# Altium footprint library Connectors THD.PcbLib: 631 footprints (part 2 of 46) (continued)
## 3M_10236-5212PC [mm] "36 contacts, Mini D Ribbon (MDR), 102 Series, .050\" Boardmount Through-hole Right Angle Receptacle-Shielded" (continued)
  text "17" at 10.8,-5.247 h1.02
  text "18" at 12.06,-3.342 h1.02
  text "36" at 11.935,0.468 h1.02
3D body: height 9.4, standoff -3.81, extent -21.717,-5.647 21.717,11.117

## 3M_10236-6212PC [mm] "36 contacts, Mini D Ribbon (MDR), 102 Series, .050\" Boardmount Through-hole Vertical Receptacle-Shielded"
height 9.4
pads (38):
  round 1.4 hole 0.8: 1(10.795,2.86) 2(9.525,0.955) 3(8.255,2.86) 4(6.985,0.955) 5(5.715,2.86) 6(4.445,0.955) 7(3.175,2.86) 8(1.905,0.955) 9(0.635,2.86) 10(-0.635,0.955) 11(-1.905,2.86) 12(-3.175,0.955) 13(-4.445,2.86) 14(-5.715,0.955) 15(-6.985,2.86) 16(-8.255,0.955) 17(-9.525,2.86) 18(-10.795,0.955) 19(10.795,-0.955) 20(9.525,-2.86) 21(8.255,-0.955) 22(6.985,-2.86) 23(5.715,-0.955) 24(4.445,-2.86) 25(3.175,-0.955) 26(1.905,-2.86) 27(0.635,-0.955) 28(-0.635,-2.86) 29(-1.905,-0.955) 30(-3.175,-2.86) 31(-4.445,-0.955) 32(-5.715,-2.86) 33(-6.985,-0.955) 34(-8.255,-2.86) 35(-9.525,-0.955) 36(-10.795,-2.86)
  round 5.5 hole 2.8: 37(-18.796,0) 38(18.796,0)
Top Overlay:
  circle w0.3: c10.795,5.207 r0.15
  lines w0.2: -21.717,-0.413 -21.717,-4.318 -20.447,-4.318 -20.447,-4.572 20.447,-4.572 20.447,-4.318 21.717,-4.318 21.717,-0.413 ; -21.717,0.413 -21.717,4.318 -20.447,4.318 -20.447,4.572 20.447,4.572 20.447,4.318 21.717,4.318 21.717,0.413 ; -21.463,-4.318 -21.463,-1.261 ; -21.463,1.261 -21.463,4.318 ; -16.764,-2.139 -16.764,-3.556 -14.224,-3.556 -14.224,3.556 -16.764,3.556 -16.764,2.139 ; -16.31,-1.587 -15.494,-1.587 -15.494,1.587 -16.31,1.587 ; -16.129,-3.556 -16.129,-1.587 ; -16.129,1.587 -16.129,3.556 ; -13.323,1.725 cw(c-12.065,1.896) -12.392,3.123 ; -12.86,-0.044 -12.355,-1.928 ; 12.811,2.933 cw(c12.065,1.905) 13.292,1.576 12.878,0.032 ; 16.129,-3.556 16.129,-1.587 ; 16.129,1.587 16.129,3.556 ; 16.31,-1.587 15.494,-1.587 15.494,1.587 16.31,1.587 ; 16.764,-2.139 16.764,-3.556 14.224,-3.556 14.224,3.556 16.764,3.556 16.764,2.139 ; 21.463,-4.318 21.463,-1.261 ; 21.463,1.261 21.463,4.318
  text "1" at 12.019,2.246 h1.02
  text "2" at 10.857,0.468 h1.02
  text "20" at 10.665,-3.459 h1.02
  text "19" at 11.831,-1.436 h1.02
  text "35" at -12.185,-1.569 h1.02
  text "17" at -11.933,2.241 h1.02
  text "18" at -13.34,0.336 h1.02
  text "36" at -13.465,-3.464 h1.02
Mechanical 8:
  drawing of 156 lines, arcs and shapes, not listed
Mechanical 14:
  circle w0.1: c-18.796,0 r1.245
  circle w0.1: c18.796,0 r1.245
  lines w0.1: -21.463,-4.318 -21.463,4.318 ; -16.129,-3.556 -16.129,-1.587 ; -16.129,1.587 -16.129,3.556 ; 16.129,-3.556 16.129,-1.587 ; 16.129,1.587 16.129,3.556 ; 21.463,-4.318 21.463,4.318 ; -21.717,-4.318 -21.717,4.318 -20.447,4.318 -20.447,4.572 20.447,4.572 20.447,4.318 21.717,4.318 21.717,-4.318 20.447,-4.318 20.447,-4.572 -20.447,-4.572 -20.447,-4.318 -21.717,-4.318 ; -16.764,-3.556 -16.764,-1.587 -15.494,-1.587 -15.494,1.587 -16.764,1.587 -16.764,3.556 -14.224,3.556 -14.224,-3.556 -16.764,-3.556 ; -13.292,1.576 cw(c-12.065,1.905) -12.065,3.175 12.065,3.175 cw(c12.065,1.905) 13.292,1.576 12.286,-2.178 cw(c11.015,-1.868) 10.987,-3.175 -10.987,-3.175 cw(c-11.015,-1.868) -12.286,-2.178 -13.292,1.576 ; 14.224,-3.556 14.224,3.556 16.764,3.556 16.764,1.587 15.494,1.587 15.494,-1.587 16.764,-1.587 16.764,-3.556 14.224,-3.556
  text "35" at -12.185,-1.569 h1.02
  text "17" at -11.933,2.241 h1.02
  text "18" at -13.34,0.336 h1.02
  text "36" at -13.465,-3.464 h1.02
  text "1" at 12.019,2.246 h1.02
  text "2" at 10.857,0.468 h1.02
  text "20" at 10.665,-3.459 h1.02
  text "19" at 11.831,-1.436 h1.02
3D body: height 11.18, standoff -3.4, extent -21.717,-4.572 21.717,4.572

## 3M_10268-6212PC [mm] "68 contacts, Mini D Ribbon (MDR), .050\" Boardmount Through-hole Vertical Receptacle - Shielded"
height 11
pads (70):
  round 1.4 hole 0.8: 1(20.955,2.858) 2(19.685,0.953) 3(18.415,2.858) 4(17.145,0.953) 5(15.875,2.858) 6(14.605,0.953) 7(13.335,2.858) 8(12.065,0.953) 9(10.795,2.858) 10(9.525,0.953) 11(8.255,2.858) 12(6.985,0.953) 13(5.715,2.858) 14(4.445,0.953) 15(3.175,2.858) 16(1.905,0.953) 17(0.635,2.858) 18(-0.635,0.953) 19(-1.905,2.858) 20(-3.175,0.953) 21(-4.445,2.858) 22(-5.715,0.953) 23(-6.985,2.858) 24(-8.255,0.953) 25(-9.525,2.858) 26(-10.795,0.953) 27(-12.065,2.858) 28(-13.335,0.953) 29(-14.605,2.858) 30(-15.875,0.953) 31(-17.145,2.858) 32(-18.415,0.953) 33(-19.685,2.858) 34(-20.955,0.953) 35(20.955,-0.952) 36(19.685,-2.857) 37(18.415,-0.952) 38(17.145,-2.857) 39(15.875,-0.952) 40(14.605,-2.857) 41(13.335,-0.952) 42(12.065,-2.857) 43(10.795,-0.952) 44(9.525,-2.857) 45(8.255,-0.952) 46(6.985,-2.857) 47(5.715,-0.952) 48(4.445,-2.857) 49(3.175,-0.952) 50(1.905,-2.857) 51(0.635,-0.952) 52(-0.635,-2.857) 53(-1.905,-0.952) 54(-3.175,-2.857) 55(-4.445,-0.952) 56(-5.715,-2.857) 57(-6.985,-0.952) 58(-8.255,-2.857) 59(-9.525,-0.952) 60(-10.795,-2.857) 61(-12.065,-0.952) 62(-13.335,-2.857) 63(-14.605,-0.952) 64(-15.875,-2.857) 65(-17.145,-0.952) 66(-18.415,-2.857) 67(-19.685,-0.952) 68(-20.955,-2.857)
  round 5.5 hole 2.8: 69(-28.956,0) 70(28.956,0)
Top Overlay:
  circle w0.3: c20.955,5.207 r0.15
  lines w0.2: -31.877,-0.684 -31.877,-4.318 -30.607,-4.318 -30.607,-4.572 30.607,-4.572 30.607,-4.318 31.877,-4.318 31.877,-0.684 ; -31.877,0.684 -31.877,4.318 -30.607,4.318 -30.607,4.572 30.607,4.572 30.607,4.318 31.877,4.318 31.877,0.684 ; -31.623,-4.318 -31.623,-1.374 ; -31.623,1.374 -31.623,4.318 ; -26.924,-2.207 -26.924,-3.556 -24.384,-3.556 -24.384,3.556 -26.924,3.556 -26.924,2.207 ; -26.41,-1.587 -25.654,-1.587 -25.654,1.588 -26.41,1.588 ; -26.289,-3.556 -26.289,-1.587 ; -26.289,1.588 -26.289,3.556 ; -23.483,1.734 cw(c-22.225,1.905) -22.551,3.132 ; -23.02,-0.035 -22.515,-1.919 ; 22.971,2.933 cw(c22.225,1.905) 23.452,1.576 23.038,0.032 ; 26.289,-3.556 26.289,-1.587 ; 26.289,1.588 26.289,3.556 ; 26.41,-1.587 25.654,-1.587 25.654,1.588 26.41,1.588 ; 26.924,-2.207 26.924,-3.556 24.384,-3.556 24.384,3.556 26.924,3.556 26.924,2.207 ; 31.623,-4.318 31.623,-1.374 ; 31.623,1.374 31.623,4.318
  text "1" at 22.106,2.358 h1.02
  text "2" at 20.622,0.453 h1.02
  text "35" at 22.051,-1.452 h1.02
  text "36" at 20.804,-3.357 h1.02
  text "34" at -23.693,0.453 h1.02
  text "33" at -22.4,2.358 h1.02
  text "67" at -22.4,-1.452 h1.02
  text "68" at -23.67,-3.357 h1.02
Mechanical 8:
  lines w0.1: -29.956,0 -28.956,0 -28.956,1 ; -21.955,-2.857 -20.955,-2.857 -20.955,-1.857 ; -21.955,0.953 -20.955,0.953 -20.955,1.953 ; -20.685,-0.952 -19.685,-0.952 -19.685,0.048 ; -20.685,2.858 -19.685,2.858 -19.685,3.858 ; -19.415,-2.857 -18.415,-2.857 -18.415,-1.857 ; -19.415,0.953 -18.415,0.953 -18.415,1.953 ; -18.145,-0.952 -17.145,-0.952 -17.145,0.048 ; -18.145,2.858 -17.145,2.858 -17.145,3.858 ; -16.875,-2.857 -15.875,-2.857 -15.875,-1.857 ; -16.875,0.953 -15.875,0.953 -15.875,1.953 ; -15.605,-0.952 -14.605,-0.952 -14.605,0.048 ; -15.605,2.858 -14.605,2.858 -14.605,3.858 ; -14.335,-2.857 -13.335,-2.857 -13.335,-1.857 ; -14.335,0.953 -13.335,0.953 -13.335,1.953 ; -13.065,-0.952 -12.065,-0.952 -12.065,0.048 ; -13.065,2.858 -12.065,2.858 -12.065,3.858 ; -11.795,-2.857 -10.795,-2.857 -10.795,-1.857 ; -11.795,0.953 -10.795,0.953 -10.795,1.953 ; -10.525,-0.952 -9.525,-0.952 -9.525,0.048 ; -10.525,2.858 -9.525,2.858 -9.525,3.858 ; -9.255,-2.857 -8.255,-2.857 -8.255,-1.857 ; -9.255,0.953 -8.255,0.953 -8.255,1.953 ; -7.985,-0.952 -6.985,-0.952 -6.985,0.048 ; -7.985,2.858 -6.985,2.858 -6.985,3.858 ; -6.715,-2.857 -5.715,-2.857 -5.715,-1.857 ; -6.715,0.953 -5.715,0.953 -5.715,1.953 ; -5.445,-0.952 -4.445,-0.952 -4.445,0.048 ; -5.445,2.858 -4.445,2.858 -4.445,3.858 ; -4.175,-2.857 -3.175,-2.857 -3.175,-1.857 ; -4.175,0.953 -3.175,0.953 -3.175,1.953 ; -2.905,-0.952 -1.905,-0.952 -1.905,0.048 ; -2.905,2.858 -1.905,2.858 -1.905,3.858 ; -1.635,-2.857 -0.635,-2.857 -0.635,-1.857 ; -1.635,0.953 -0.635,0.953 -0.635,1.953 ; -1,0 0,0 0,-1 ; -0.365,-0.952 0.635,-0.952 0.635,0.048 ; -0.365,2.858 0.635,2.858 0.635,3.858 ; 0.905,-2.857 1.905,-2.857 1.905,-1.857 ; 0.905,0.953 1.905,0.953 1.905,1.953 ; 2.175,-0.952 3.175,-0.952 3.175,0.048 ; 2.175,2.858 3.175,2.858 3.175,3.858 ; 3.445,-2.857 4.445,-2.857 4.445,-1.857 ; 3.445,0.953 4.445,0.953 4.445,1.953 ; 4.715,-0.952 5.715,-0.952 5.715,0.048 ; 4.715,2.858 5.715,2.858 5.715,3.858 ; 5.985,-2.857 6.985,-2.857 6.985,-1.857 ; 5.985,0.953 6.985,0.953 6.985,1.953 ; 7.255,-0.952 8.255,-0.952 8.255,0.048 ; 7.255,2.858 8.255,2.858 8.255,3.858 ; 8.525,-2.857 9.525,-2.857 9.525,-1.857 ; 8.525,0.953 9.525,0.953 9.525,1.953 ; 9.795,-0.952 10.795,-0.952 10.795,0.048 ; 9.795,2.858 10.795,2.858 10.795,3.858 ; 11.065,-2.857 12.065,-2.857 12.065,-1.857 ; 11.065,0.953 12.065,0.953 12.065,1.953 ; 12.335,-0.952 13.335,-0.952 13.335,0.048 ; 12.335,2.858 13.335,2.858 13.335,3.858 ; 13.605,-2.857 14.605,-2.857 14.605,-1.857 ; 13.605,0.953 14.605,0.953 14.605,1.953 ; 14.875,-0.952 15.875,-0.952 15.875,0.048 ; 14.875,2.858 15.875,2.858 15.875,3.858 ; 16.145,-2.857 17.145,-2.857 17.145,-1.857 ; 16.145,0.953 17.145,0.953 17.145,1.953 ; 17.415,-0.952 18.415,-0.952 18.415,0.048 ; 17.415,2.858 18.415,2.858 18.415,3.858 ; 18.685,-2.857 19.685,-2.857 19.685,-1.857 ; 18.685,0.953 19.685,0.953 19.685,1.953 ; 19.955,-0.952 20.955,-0.952 20.955,0.048 ; 19.955,2.858 20.955,2.858 20.955,3.858 ; 27.956,0 28.956,0 28.956,1
Mechanical 14:
  drawing of 252 lines, arcs and shapes, not listed
3D body: height 11.18, standoff -3.4, extent -31.877,-4.572 31.877,4.572

## 3M_950420-6102-AR [mm] "20 Contacts - mm x 2 mm Straight, Boardmount Socket"
height 4.3
pads (20):
  round 1.5 hole 0.8: 1(-9,1) 2(-9,-1) 3(-7,1) 4(-7,-1) 5(-5,1) 6(-5,-1) 7(-3,1) 8(-3,-1) 9(-1,1) 10(-1,-1) 11(1,1) 12(1,-1) 13(3,1) 14(3,-1) 15(5,1) 16(5,-1) 17(7,1) 18(7,-1) 19(9,1) 20(9,-1)
Top Overlay:
  circle w0.3: c-8.925,2.925 r0.15
  lines w0.2: -10.25,-2.3 10.25,-2.3 10.25,2.3 -10.25,2.3 -10.25,-2.3
  text "1" at -10.988,0.55 h1.2
  text "20" at 10.71,-1.565 h1.2
Mechanical 8:
  lines w0.1: -9.5,-1 -9,-1 ; -9.5,1 -9,1 ; -9,-1.5 -9,-1 ; -9,-0.5 -9,-1 ; -9,0.5 -9,1 ; -9,1.5 -9,1 ; -8.5,-1 -9,-1 ; -8.5,1 -9,1 ; -7.5,-1 -7,-1 ; -7.5,1 -7,1 ; -7,-1.5 -7,-1 ; -7,-0.5 -7,-1 ; -7,0.5 -7,1 ; -7,1.5 -7,1 ; -6.5,-1 -7,-1 ; -6.5,1 -7,1 ; -5.5,-1 -5,-1 ; -5.5,1 -5,1 ; -5,-1.5 -5,-1 ; -5,-0.5 -5,-1 ; -5,0.5 -5,1 ; -5,1.5 -5,1 ; -4.5,-1 -5,-1 ; -4.5,1 -5,1 ; -3.5,-1 -3,-1 ; -3.5,1 -3,1 ; -3,-1.5 -3,-1 ; -3,-0.5 -3,-1 ; -3,0.5 -3,1 ; -3,1.5 -3,1 ; -2.5,-1 -3,-1 ; -2.5,1 -3,1 ; -1.5,-1 -1,-1 ; -1.5,1 -1,1 ; -1,-1.5 -1,-1 ; -1,-0.5 -1,-1 ; -1,0.5 -1,1 ; -1,1.5 -1,1 ; -0.5,-1 -1,-1 ; -0.5,0 0,0 ; -0.5,1 -1,1 ; 0,-0.5 0,0 ; 0,0.5 0,0 ; 0.5,-1 1,-1 ; 0.5,0 0,0 ; 0.5,1 1,1 ; 1,-1.5 1,-1 ; 1,-0.5 1,-1 ; 1,0.5 1,1 ; 1,1.5 1,1 ; 1.5,-1 1,-1 ; 1.5,1 1,1 ; 2.5,-1 3,-1 ; 2.5,1 3,1 ; 3,-1.5 3,-1 ; 3,-0.5 3,-1 ; 3,0.5 3,1 ; 3,1.5 3,1 ; 3.5,-1 3,-1 ; 3.5,1 3,1 ; 4.5,-1 5,-1 ; 4.5,1 5,1 ; 5,-1.5 5,-1 ; 5,-0.5 5,-1 ; 5,0.5 5,1 ; 5,1.5 5,1 ; 5.5,-1 5,-1 ; 5.5,1 5,1 ; 6.5,-1 7,-1 ; 6.5,1 7,1 ; 7,-1.5 7,-1 ; 7,-0.5 7,-1 ; 7,0.5 7,1 ; 7,1.5 7,1 ; 7.5,-1 7,-1 ; 7.5,1 7,1 ; 8.5,-1 9,-1 ; 8.5,1 9,1 ; 9,-1.5 9,-1 ; 9,-0.5 9,-1 ; 9,0.5 9,1 ; 9,1.5 9,1 ; 9.5,-1 9,-1 ; 9.5,1 9,1
Mechanical 14:
  drawing of 245 lines, arcs and shapes, not listed
  text "1" at -10.988,0.55 h1.2
  text "20" at 10.71,-1.565 h1.2
3D body: height 4.3, standoff -2.7, extent -10.25,-2.3 10.25,2.3

## 3M_950432-6102-AR [mm] "32 Contacts - mm x 2 mm Straight, Boardmount Socket"
height 4.3
pads (32):
  round 1.5 hole 0.8: 1(-15,1) 2(-15,-1) 3(-13,1) 4(-13,-1) 5(-11,1) 6(-11,-1) 7(-9,1) 8(-9,-1) 9(-7,1) 10(-7,-1) 11(-5,1) 12(-5,-1) 13(-3,1) 14(-3,-1) 15(-1,1) 16(-1,-1) 17(1,1) 18(1,-1) 19(3,1) 20(3,-1) 21(5,1) 22(5,-1) 23(7,1) 24(7,-1) 25(9,1) 26(9,-1) 27(11,1) 28(11,-1) 29(13,1) 30(13,-1) 31(15,1) 32(15,-1)
Top Overlay:
  circle w0.3: c-14.925,2.925 r0.15
  lines w0.2: -16.25,-2.3 -16.25,2.3 16.25,2.3 16.25,-2.3 -16.25,-2.3
  text "32" at 16.685,-1.515 h1.2
  text "1" at -16.988,0.55 h1.2
Mechanical 8:
  lines w0.1: -15.5,-1 -15,-1 ; -15.5,1 -15,1 ; -15,-1.5 -15,-1 ; -15,-0.5 -15,-1 ; -15,0.5 -15,1 ; -15,1.5 -15,1 ; -14.5,-1 -15,-1 ; -14.5,1 -15,1 ; -13.5,-1 -13,-1 ; -13.5,1 -13,1 ; -13,-1.5 -13,-1 ; -13,-0.5 -13,-1 ; -13,0.5 -13,1 ; -13,1.5 -13,1 ; -12.5,-1 -13,-1 ; -12.5,1 -13,1 ; -11.5,-1 -11,-1 ; -11.5,1 -11,1 ; -11,-1.5 -11,-1 ; -11,-0.5 -11,-1 ; -11,0.5 -11,1 ; -11,1.5 -11,1 ; -10.5,-1 -11,-1 ; -10.5,1 -11,1 ; -9.5,-1 -9,-1 ; -9.5,1 -9,1 ; -9,-1.5 -9,-1 ; -9,-0.5 -9,-1 ; -9,0.5 -9,1 ; -9,1.5 -9,1 ; -8.5,-1 -9,-1 ; -8.5,1 -9,1 ; -7.5,-1 -7,-1 ; -7.5,1 -7,1 ; -7,-1.5 -7,-1 ; -7,-0.5 -7,-1 ; -7,0.5 -7,1 ; -7,1.5 -7,1 ; -6.5,-1 -7,-1 ; -6.5,1 -7,1 ; -5.5,-1 -5,-1 ; -5.5,1 -5,1 ; -5,-1.5 -5,-1 ; -5,-0.5 -5,-1 ; -5,0.5 -5,1 ; -5,1.5 -5,1 ; -4.5,-1 -5,-1 ; -4.5,1 -5,1 ; -3.5,-1 -3,-1 ; -3.5,1 -3,1 ; -3,-1.5 -3,-1 ; -3,-0.5 -3,-1 ; -3,0.5 -3,1 ; -3,1.5 -3,1 ; -2.5,-1 -3,-1 ; -2.5,1 -3,1 ; -1.5,-1 -1,-1 ; -1.5,1 -1,1 ; -1,-1.5 -1,-1 ; -1,-0.5 -1,-1 ; -1,0.5 -1,1 ; -1,1.5 -1,1 ; -0.5,-1 -1,-1 ; -0.5,0 0,0 ; -0.5,1 -1,1 ; 0,-0.5 0,0 ; 0,0.5 0,0 ; 0.5,-1 1,-1 ; 0.5,0 0,0 ; 0.5,1 1,1 ; 1,-1.5 1,-1 ; 1,-0.5 1,-1 ; 1,0.5 1,1 ; 1,1.5 1,1 ; 1.5,-1 1,-1 ; 1.5,1 1,1 ; 2.5,-1 3,-1 ; 2.5,1 3,1 ; 3,-1.5 3,-1 ; 3,-0.5 3,-1 ; 3,0.5 3,1 ; 3,1.5 3,1 ; 3.5,-1 3,-1 ; 3.5,1 3,1 ; 4.5,-1 5,-1 ; 4.5,1 5,1 ; 5,-1.5 5,-1 ; 5,-0.5 5,-1 ; 5,0.5 5,1 ; 5,1.5 5,1 ; 5.5,-1 5,-1 ; 5.5,1 5,1 ; 6.5,-1 7,-1 ; 6.5,1 7,1 ; 7,-1.5 7,-1 ; 7,-0.5 7,-1 ; 7,0.5 7,1 ; 7,1.5 7,1 ; 7.5,-1 7,-1 ; 7.5,1 7,1 ; 8.5,-1 9,-1 ; 8.5,1 9,1 ; 9,-1.5 9,-1 ; 9,-0.5 9,-1 ; 9,0.5 9,1 ; 9,1.5 9,1 ; 9.5,-1 9,-1 ; 9.5,1 9,1 ; 10.5,-1 11,-1 ; 10.5,1 11,1 ; 11,-1.5 11,-1 ; 11,-0.5 11,-1 ; 11,0.5 11,1 ; 11,1.5 11,1 ; 11.5,-1 11,-1 ; 11.5,1 11,1 ; 12.5,-1 13,-1 ; 12.5,1 13,1 ; 13,-1.5 13,-1 ; 13,-0.5 13,-1 ; 13,0.5 13,1 ; 13,1.5 13,1 ; 13.5,-1 13,-1 ; 13.5,1 13,1 ; 14.5,-1 15,-1 ; 14.5,1 15,1 ; 15,-1.5 15,-1 ; 15,-0.5 15,-1 ; 15,0.5 15,1 ; 15,1.5 15,1 ; 15.5,-1 15,-1 ; 15.5,1 15,1
Mechanical 14:
  drawing of 389 lines, arcs and shapes, not listed
  text "32" at 16.685,-1.515 h1.2
  text "1" at -16.988,0.55 h1.2
3D body: height 4.3, standoff -2.7, extent -16.25,-2.3 16.25,2.3

## 3M_N2510-5002RB [mm] "10 Contacts - Right Angle .100\" x .100\" Low Profile Four-Wall Header"
height 8.59
pads (10):
  round 1.6 hole 1: 1(-5.08,-1.27) 2(-5.08,1.27) 3(-2.54,-1.27) 4(-2.54,1.27) 5(0,-1.27) 6(0,1.27) 7(2.54,-1.27) 8(2.54,1.27) 9(5.08,-1.27) 10(5.08,1.27)
Top Overlay:
  circle w0.3: c-6.85,-1.27 r0.15
  lines w0.2: -6.093,11.28 -5.077,8.74 -4.061,11.28 ; -2.854,11.28 cw(c-2.854,10.518) -2.092,10.518 -2.092,4.015 2.099,4.015 2.099,10.518 ; -2.092,4.76 2.092,4.76 ; -0.249,4.76 -0.249,10.526 0.012,10.86 0.125,10.86 0.38,10.534 -0.243,10.534 ; 0.38,4.76 0.38,10.526 ; 1.781,2.466 1.781,4.015 3.051,4.015 3.051,6.301 cw(c3.813,6.301) 4.575,6.301 4.575,4.015 5.845,4.015 ; 2.099,10.518 cw(c2.861,10.518) 2.772,11.274 ; 2.772,11.28 2.772,10.06 4.855,10.06 4.855,11.28 ; 5.845,2.466 5.845,11.28 ; -10.004,1.882 -8.252,1.882 ccw(c-7.998,1.882) -7.744,1.882 -7.744,2.466 7.75,2.466 7.75,1.882 ccw(c8.004,1.882) 8.258,1.882 10.011,1.882 10.011,11.28 -10.004,11.28 -10.004,1.882
  text "10" at 6.5,0.3 h1.02
Mechanical 14:
  circle w0.3: c-6.85,-1.27 r0.15
  lines w0.1: -6.093,11.28 -5.077,8.74 -4.061,11.28 ; -2.854,11.28 cw(c-2.854,10.518) -2.092,10.518 -2.092,4.015 2.099,4.015 2.099,10.518 ; -2.092,4.76 2.092,4.76 ; -0.249,4.76 -0.249,10.526 0.012,10.86 0.125,10.86 0.38,10.534 -0.243,10.534 ; 0.38,4.76 0.38,10.526 ; 1.781,2.466 1.781,4.015 3.051,4.015 3.051,6.301 cw(c3.813,6.301) 4.575,6.301 4.575,4.015 5.845,4.015 ; 2.099,10.518 cw(c2.861,10.518) 2.772,11.274 ; 2.772,11.28 2.772,10.06 4.855,10.06 4.855,11.28 ; 5.845,2.466 5.845,11.28 ; -10.004,1.882 -8.252,1.882 ccw(c-7.998,1.882) -7.744,1.882 -7.744,2.466 7.75,2.466 7.75,1.882 ccw(c8.004,1.882) 8.258,1.882 10.011,1.882 10.011,11.28 -10.004,11.28 -10.004,1.882
  text "10" at 6.5,0.3 h1.02
Mechanical 15:
  lines w0.05: -0.5,0 0.5,0 ; 0,-0.5 0,0.5
3D body: height 8.64, standoff -3.98, extent -10.004,-1.587 10.011,11.267

## 3M_N2510-6002RB [mm] "10 Contacts - Straight .100\" x .100\" Low Profile Four-Wall Header"
height 10.03
pads (10):
  round 1.6 hole 1: 1(-5.08,-1.27) 2(-5.08,1.27) 3(-2.54,-1.27) 4(-2.54,1.27) 5(0,-1.27) 6(0,1.27) 7(2.54,-1.27) 8(2.54,1.27) 9(5.08,-1.27) 10(5.08,1.27)
Top Overlay:
  circle w0.3: c-5.08,-4.699 r0.15
  lines w0.2: -8.992,-1.603 -6.579,-1.603 -6.579,1.603 -8.992,1.603 ; -8.992,-1.524 -9.296,-1.524 -9.296,1.524 -8.992,1.524 ; -5.944,-4.064 -5.08,-3.2 -4.216,-4.064 ; -2.096,-4.064 -2.096,-2.438 ; -2.096,-3.2 -8.992,-3.2 -8.992,3.15 4.128,3.15 ; 2.095,-3.2 8.992,-3.2 8.992,3.15 6.223,3.15 ; 2.095,-3.102 1.778,-3.102 1.778,-4.064 -10.008,-4.064 -10.008,4.064 -9.347,4.064 cw(c-8.89,4.064) -8.433,4.064 8.433,4.064 cw(c8.89,4.064) 9.347,4.064 10.008,4.064 10.008,-4.064 5.842,-4.064 5.842,-3.835 2.095,-3.835 2.095,-2.438 ; 2.769,-3.835 2.769,-3.2 ; 4.851,-3.835 4.851,-3.2 ; 8.992,-1.603 6.579,-1.603 6.579,1.603 8.992,1.603 ; 8.992,-1.524 9.296,-1.524 9.296,1.524 8.992,1.524
  text "10" at 4.445,2.54 h1.02
Mechanical 14:
  lines w0.1: -8.992,-1.603 -6.579,-1.603 -6.579,1.603 -8.992,1.603 ; -8.992,-1.524 -9.296,-1.524 -9.296,1.524 -8.992,1.524 ; -5.944,-4.064 -5.08,-3.2 -4.216,-4.064 ; -2.096,-4.064 -2.096,-2.159 2.095,-2.159 2.095,-3.835 5.842,-3.835 5.842,-4.064 10.008,-4.064 10.008,4.064 9.347,4.064 ccw(c8.89,4.064) 8.433,4.064 -8.433,4.064 ccw(c-8.89,4.064) -9.347,4.064 -10.008,4.064 -10.008,-4.064 1.778,-4.064 1.778,-3.102 2.095,-3.102 ; -2.096,-3.2 -8.992,-3.2 -8.992,3.15 4.128,3.15 ; 2.095,-3.2 8.992,-3.2 8.992,3.15 6.223,3.15 ; 2.769,-3.835 2.769,-3.2 ; 4.851,-3.835 4.851,-3.2 ; 8.992,-1.603 6.579,-1.603 6.579,1.603 8.992,1.603 ; 8.992,-1.524 9.296,-1.524 9.296,1.524 8.992,1.524
  text "10" at 4.445,2.54 h1.02
3D body: height 9.65, standoff -2.59, extent -10.008,-4.064 10.008,4.572

## 3M_N2510-6003RB [mm] "10 Contacts - Straight .100\" x .100\" Low Profile Four-Wall Header (Solder Tail 3.94mm)"
height 10.03
pads (10):
  round 1.6 hole 1: 1(-5.08,-1.27) 2(-5.08,1.27) 3(-2.54,-1.27) 4(-2.54,1.27) 5(0,-1.27) 6(0,1.27) 7(2.54,-1.27) 8(2.54,1.27) 9(5.08,-1.27) 10(5.08,1.27)
Top Overlay:
  circle w0.3: c-5.08,-4.699 r0.15
  lines w0.2: -8.992,-1.603 -6.579,-1.603 -6.579,1.603 -8.992,1.603 ; -8.992,-1.524 -9.296,-1.524 -9.296,1.524 -8.992,1.524 ; -5.944,-4.064 -5.08,-3.2 -4.216,-4.064 ; -2.096,-4.064 -2.096,-2.438 ; -2.096,-3.2 -8.992,-3.2 -8.992,3.15 4.128,3.15 ; 2.095,-3.2 8.992,-3.2 8.992,3.15 6.223,3.15 ; 2.095,-3.102 1.778,-3.102 1.778,-4.064 -10.008,-4.064 -10.008,4.064 -9.347,4.064 cw(c-8.89,4.064) -8.433,4.064 8.433,4.064 cw(c8.89,4.064) 9.347,4.064 10.008,4.064 10.008,-4.064 5.842,-4.064 5.842,-3.835 2.095,-3.835 2.095,-2.438 ; 2.769,-3.835 2.769,-3.2 ; 4.851,-3.835 4.851,-3.2 ; 8.992,-1.603 6.579,-1.603 6.579,1.603 8.992,1.603 ; 8.992,-1.524 9.296,-1.524 9.296,1.524 8.992,1.524
  text "10" at 4.445,2.54 h1.02
Mechanical 14:
  lines w0.1: -8.992,-1.603 -6.579,-1.603 -6.579,1.603 -8.992,1.603 ; -8.992,-1.524 -9.296,-1.524 -9.296,1.524 -8.992,1.524 ; -5.944,-4.064 -5.08,-3.2 -4.216,-4.064 ; -2.096,-4.064 -2.096,-2.159 2.095,-2.159 2.095,-3.835 5.842,-3.835 5.842,-4.064 10.008,-4.064 10.008,4.064 9.347,4.064 ccw(c8.89,4.064) 8.433,4.064 -8.433,4.064 ccw(c-8.89,4.064) -9.347,4.064 -10.008,4.064 -10.008,-4.064 1.778,-4.064 1.778,-3.102 2.095,-3.102 ; -2.096,-3.2 -8.992,-3.2 -8.992,3.15 4.128,3.15 ; 2.095,-3.2 8.992,-3.2 8.992,3.15 6.223,3.15 ; 2.769,-3.835 2.769,-3.2 ; 4.851,-3.835 4.851,-3.2 ; 8.992,-1.603 6.579,-1.603 6.579,1.603 8.992,1.603 ; 8.992,-1.524 9.296,-1.524 9.296,1.524 8.992,1.524
  text "10" at 4.445,2.54 h1.02
3D body: height 9.65, standoff -3.1, extent -10.008,-4.064 10.008,4.572

## 3M_N2514-5002RB [mm] "14 Contacts - Right Angle .100\" x .100\" Low Profile Four-Wall Header"
height 8.59
pads (14):
  round 1.6 hole 1: 1(-7.62,-1.27) 2(-7.62,1.27) 3(-5.08,-1.27) 4(-5.08,1.27) 5(-2.54,-1.27) 6(-2.54,1.27) 7(0,-1.27) 8(0,1.27) 9(2.54,-1.27) 10(2.54,1.27) 11(5.08,-1.27) 12(5.08,1.27) 13(7.62,-1.27) 14(7.62,1.27)
Top Overlay:
  circle w0.3: c-9.39,-1.27 r0.15
  lines w0.2: -8.568,11.186 -7.552,8.646 -6.536,11.186 ; -3.297,11.186 cw(c-3.297,9.916) -2.027,9.916 -2.027,4.252 -1.392,3.617 1.529,3.617 2.164,4.252 2.164,9.916 cw(c3.434,9.916) 3.434,11.186 ; -2.027,4.76 2.164,4.76 ; -0.249,4.76 -0.249,10.526 0.012,10.86 0.125,10.86 0.38,10.534 -0.243,10.534 ; 0.38,4.76 0.38,10.526 ; 4.399,2.372 4.399,11.186 ; 4.399,3.922 5.656,3.922 5.656,6.208 cw(c6.418,6.208) 7.18,6.208 7.18,3.922 8.45,3.922 ; 5.377,11.186 5.377,9.967 7.46,9.967 7.46,11.186 ; 5.656,4.76 7.18,4.76 ; 8.45,2.372 8.45,11.186 ; -12.479,1.788 -10.727,1.788 ccw(c-10.473,1.788) -10.219,1.788 -10.219,2.372 10.355,2.372 10.355,1.788 ccw(c10.609,1.788) 10.863,1.788 12.616,1.788 12.616,11.186 -12.479,11.186 -12.479,1.788
  text "14" at 9.105,0.207 h1.02
Mechanical 14:
  circle w0.3: c-9.39,-1.27 r0.15
  lines w0.1: -8.568,11.186 -7.552,8.646 -6.536,11.186 ; -3.297,11.186 cw(c-3.297,9.916) -2.027,9.916 -2.027,4.252 -1.392,3.617 1.529,3.617 2.164,4.252 2.164,9.916 cw(c3.434,9.916) 3.434,11.186 ; -2.027,4.76 2.164,4.76 ; -0.249,4.76 -0.249,10.526 0.012,10.86 0.125,10.86 0.38,10.534 -0.243,10.534 ; 0.38,4.76 0.38,10.526 ; 4.399,2.372 4.399,11.186 ; 4.399,3.922 5.656,3.922 5.656,6.208 cw(c6.418,6.208) 7.18,6.208 7.18,3.922 8.45,3.922 ; 5.377,11.186 5.377,9.967 7.46,9.967 7.46,11.186 ; 5.656,4.76 7.18,4.76 ; 8.45,2.372 8.45,11.186 ; -12.479,1.788 -10.727,1.788 ccw(c-10.473,1.788) -10.219,1.788 -10.219,2.372 10.355,2.372 10.355,1.788 ccw(c10.609,1.788) 10.863,1.788 12.616,1.788 12.616,11.186 -12.479,11.186 -12.479,1.788
  text "14" at 9.105,0.207 h1.02
Mechanical 15:
  lines w0.05: -0.5,0 0.5,0 ; 0,-0.5 0,0.5
3D body: height 8.64, standoff -3.98, extent -12.479,-1.681 12.616,11.174

## 3M_N2514-6002RB [mm] "14 Contacts - Straight .100\" x .100\" Low Profile Four-Wall Header"
height 10.03
pads (14):
  round 1.6 hole 1: 1(-7.62,-1.27) 2(-7.62,1.27) 3(-5.08,-1.27) 4(-5.08,1.27) 5(-2.54,-1.27) 6(-2.54,1.27) 7(0,-1.27) 8(0,1.27) 9(2.54,-1.27) 10(2.54,1.27) 11(5.08,-1.27) 12(5.08,1.27) 13(7.62,-1.27) 14(7.62,1.27)
Top Overlay:
  circle w0.3: c-7.62,-4.699 r0.15
  lines w0.2: -11.532,-1.603 -9.119,-1.603 -9.119,1.603 -11.532,1.603 ; -11.532,-1.524 -11.836,-1.524 -11.836,1.524 -11.532,1.524 ; -8.484,-4.064 -7.62,-3.2 -6.756,-4.064 ; -6.668,3.15 -11.532,3.15 -11.532,-3.2 -2.096,-3.2 ; -6.668,4.064 -6.668,2.159 -5.959,2.159 ; -2.477,2.518 -2.477,4.064 ; -2.477,3.15 2.476,3.15 ; -2.096,-4.064 -2.096,-2.438 ; 2.095,-4.064 2.095,-2.438 ; 2.095,-3.2 11.532,-3.2 11.532,3.15 8.763,3.15 ; 2.476,2.518 2.476,4.064 ; 5.309,-3.835 5.309,-3.2 ; 5.959,2.159 6.668,2.159 6.668,4.064 ; 7.391,-3.835 7.391,-3.2 ; 11.532,-1.603 9.119,-1.603 9.119,1.603 11.532,1.603 ; 11.532,-1.524 11.836,-1.524 11.836,1.524 11.532,1.524 ; -12.548,-4.064 4.318,-4.064 4.318,-3.835 8.382,-3.835 8.382,-4.064 12.548,-4.064 12.548,4.064 11.887,4.064 ccw(c11.43,4.064) 10.973,4.064 -10.973,4.064 ccw(c-11.43,4.064) -11.887,4.064 -12.548,4.064 -12.548,-4.064
  text "14" at 6.985,2.667 h1.02
Mechanical 14:
  lines w0.1: -11.532,-1.603 -9.119,-1.603 -9.119,1.603 -11.532,1.603 ; -11.532,-1.524 -11.836,-1.524 -11.836,1.524 -11.532,1.524 ; -8.484,-4.064 -7.62,-3.2 -6.756,-4.064 ; -6.668,3.15 -11.532,3.15 -11.532,-3.2 -2.096,-3.2 ; -6.668,4.064 -6.668,2.159 -2.477,2.159 -2.477,4.064 ; -2.477,3.15 2.476,3.15 ; -2.096,-4.064 -2.096,-2.159 2.095,-2.159 2.095,-4.064 ; 2.095,-3.2 11.532,-3.2 11.532,3.15 8.763,3.15 ; 2.476,4.064 2.476,2.159 6.668,2.159 6.668,4.064 ; 5.309,-3.835 5.309,-3.2 ; 7.391,-3.835 7.391,-3.2 ; 11.532,-1.603 9.119,-1.603 9.119,1.603 11.532,1.603 ; 11.532,-1.524 11.836,-1.524 11.836,1.524 11.532,1.524 ; -12.548,-4.064 4.318,-4.064 4.318,-3.835 8.382,-3.835 8.382,-4.064 12.548,-4.064 12.548,4.064 11.887,4.064 ccw(c11.43,4.064) 10.973,4.064 -10.973,4.064 ccw(c-11.43,4.064) -11.887,4.064 -12.548,4.064 -12.548,-4.064
  text "14" at 6.985,2.667 h1.02
3D body: height 9.65, standoff -2.59, extent -12.548,-4.064 12.548,4.572

## 3M_N2514-6003RB [mm] "14 Contacts - Straight .100\" x .100\" Low Profile Four-Wall Header (Solder Tail 3.94mm)"
height 10.03
pads (14):
  round 1.6 hole 1: 1(-7.62,-1.27) 2(-7.62,1.27) 3(-5.08,-1.27) 4(-5.08,1.27) 5(-2.54,-1.27) 6(-2.54,1.27) 7(0,-1.27) 8(0,1.27) 9(2.54,-1.27) 10(2.54,1.27) 11(5.08,-1.27) 12(5.08,1.27) 13(7.62,-1.27) 14(7.62,1.27)
Top Overlay:
  circle w0.3: c-7.62,-4.699 r0.15
  lines w0.2: -11.532,-1.603 -9.119,-1.603 -9.119,1.603 -11.532,1.603 ; -11.532,-1.524 -11.836,-1.524 -11.836,1.524 -11.532,1.524 ; -8.484,-4.064 -7.62,-3.2 -6.756,-4.064 ; -6.668,3.15 -11.532,3.15 -11.532,-3.2 -2.096,-3.2 ; -6.668,4.064 -6.668,2.159 -5.959,2.159 ; -2.477,2.518 -2.477,4.064 ; -2.477,3.15 2.476,3.15 ; -2.096,-4.064 -2.096,-2.438 ; 2.095,-4.064 2.095,-2.438 ; 2.095,-3.2 11.532,-3.2 11.532,3.15 8.763,3.15 ; 2.476,2.518 2.476,4.064 ; 5.309,-3.835 5.309,-3.2 ; 5.959,2.159 6.668,2.159 6.668,4.064 ; 7.391,-3.835 7.391,-3.2 ; 11.532,-1.603 9.119,-1.603 9.119,1.603 11.532,1.603 ; 11.532,-1.524 11.836,-1.524 11.836,1.524 11.532,1.524 ; -12.548,-4.064 4.318,-4.064 4.318,-3.835 8.382,-3.835 8.382,-4.064 12.548,-4.064 12.548,4.064 11.887,4.064 ccw(c11.43,4.064) 10.973,4.064 -10.973,4.064 ccw(c-11.43,4.064) -11.887,4.064 -12.548,4.064 -12.548,-4.064
  text "14" at 6.985,2.667 h1.02
Mechanical 14:
  lines w0.1: -11.532,-1.603 -9.119,-1.603 -9.119,1.603 -11.532,1.603 ; -11.532,-1.524 -11.836,-1.524 -11.836,1.524 -11.532,1.524 ; -8.484,-4.064 -7.62,-3.2 -6.756,-4.064 ; -6.668,3.15 -11.532,3.15 -11.532,-3.2 -2.096,-3.2 ; -6.668,4.064 -6.668,2.159 -2.477,2.159 -2.477,4.064 ; -2.477,3.15 2.476,3.15 ; -2.096,-4.064 -2.096,-2.159 2.095,-2.159 2.095,-4.064 ; 2.095,-3.2 11.532,-3.2 11.532,3.15 8.763,3.15 ; 2.476,4.064 2.476,2.159 6.668,2.159 6.668,4.064 ; 5.309,-3.835 5.309,-3.2 ; 7.391,-3.835 7.391,-3.2 ; 11.532,-1.603 9.119,-1.603 9.119,1.603 11.532,1.603 ; 11.532,-1.524 11.836,-1.524 11.836,1.524 11.532,1.524 ; -12.548,-4.064 4.318,-4.064 4.318,-3.835 8.382,-3.835 8.382,-4.064 12.548,-4.064 12.548,4.064 11.887,4.064 ccw(c11.43,4.064) 10.973,4.064 -10.973,4.064 ccw(c-11.43,4.064) -11.887,4.064 -12.548,4.064 -12.548,-4.064
  text "14" at 6.985,2.667 h1.02
3D body: height 9.65, standoff -3.1, extent -12.548,-4.064 12.548,4.572